# Altium footprint library LDCN Components.PcbLib: 426 footprints (part 10 of 27)
Each footprint in its own frame and in the unit in brackets; x right, y up, seen from the top. Pads: shape width x height; smd on the part's side, far side on the other; paste and mask are expansions set on the pad; w line width, h text height; cw(c..) or ccw(c..) is an arc to the next point about the centre after c.
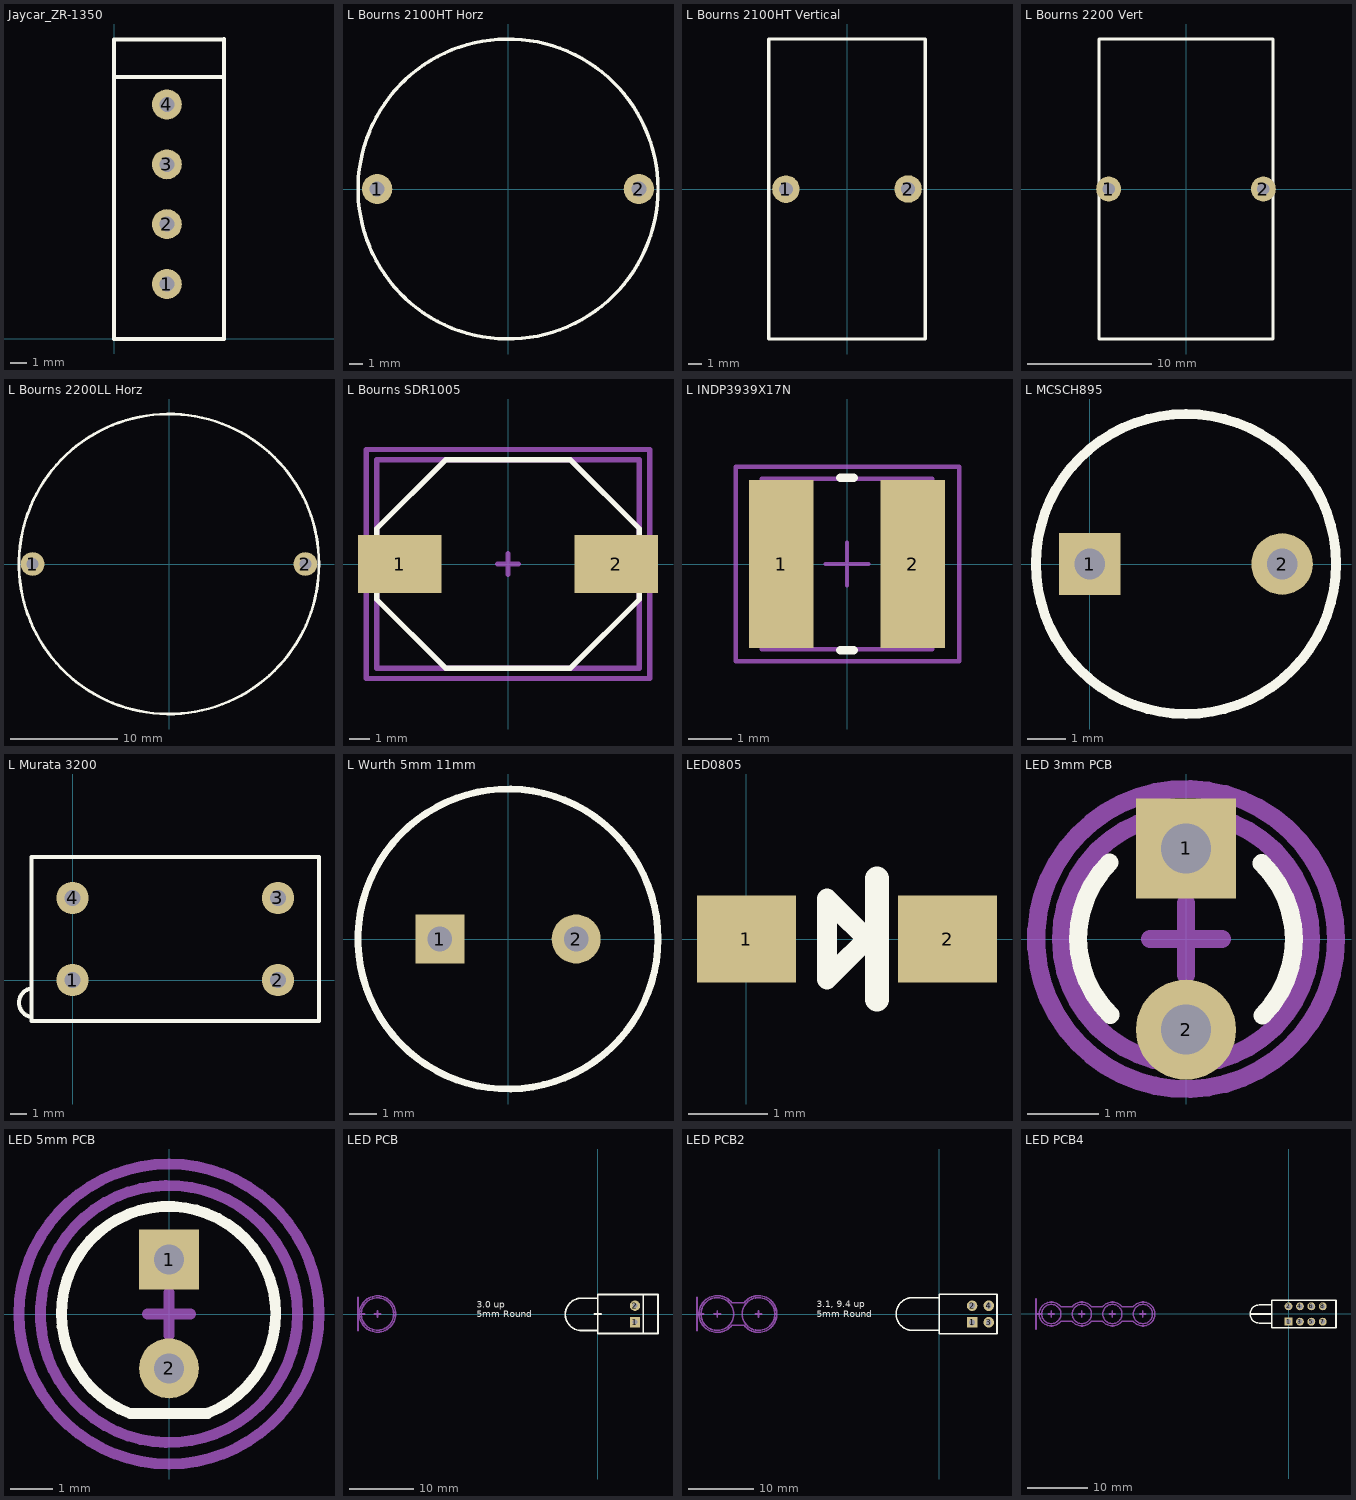
[diagram p9: the footprints below, top view; thin cyan lines are the x and y axes]

## Jaycar_ZR-1350 [mm]
pads (4):
  round 1.8 hole 0.9: 1(3.175,3.302) 2(3.175,6.902) 3(3.175,10.502) 4(3.175,14.102)
Top Overlay:
  lines w0.254: 6.604,15.748 0,15.748 0,18 ; 0,18 0,0 6.604,0 6.604,18.034 6.57,18 0,18

## L Bourns 2100HT Horz [mm] "Bourns 2100HT Series 1.1mm Hole"
height 12
pads (2):
  round 2.2 hole 1.1: 1(-9.525,0) 2(9.525,0)
Top Overlay:
  circle w0.254: c0,0 r10.922

## L Bourns 2100HT Vertical [mm] "Bourns 2100HT Series Vertical 1mm Hole"
height 21.844
pads (2):
  round 2 hole 1: 1(-4.445,0) 2(4.445,0.013)
Top Overlay:
  lines w0.254: -5.715,-10.909 -5.715,10.935 5.715,10.935 5.715,-10.909 -5.715,-10.909

## L Bourns 2200 Vert [mm] "Bourns 2200 Series Vertical 1mm Hole"
height 24.13
pads (2):
  round 2 hole 1: 1(-6.223,0) 2(6.223,0)
Top Overlay:
  lines w0.254: -6.985,-12.065 6.985,-12.065 6.985,12.065 -6.985,12.065 -6.985,-12.065

## L Bourns 2200LL Horz [mm] "Bourns 2200LL Series 1.1mm Hole"
height 13
pads (2):
  round 2.2 hole 1.1: 1(-12.7,0) 2(12.7,0)
Top Overlay:
  circle w0.254: c0,0 r13.97

## L Bourns SDR1005 [mm] "Bourns SDR1005 Inductors"
height 5
pads (2):
  rect 4x2.8 smd: 1(-5.2,0) 2(5.2,0)
Top Overlay:
  lines w0.254: -6.3,-1.7 -3,-5 3,-5 6.3,-1.7 6.3,1.7 3,5 -3,5 -6.3,1.7 -6.3,-1.7
Mechanical 13:
  lines w0.254: -6.3,-5 6.3,-5 6.3,5 -6.3,5 -6.3,-5
Mechanical 15:
  lines w0.254: -0.5,0 0.5,0 ; 0,-0.5 0,0.5 ; -6.8,-5.5 -6.8,5.5 6.8,5.5 6.8,-5.5 -6.8,-5.5
3D body: height 1, standoff 0, extent -6.3,-5 6.3,5

## L INDP3939X17N [mm] "Precision Wire Wound Inductor, 2-Leads, Body 3.9x3.9mm, IPC Medium Density"
height 1.7
pads (2):
  rect 1.5x3.9 smd: 1(-1.525,0) 2(1.525,0)
Top Overlay:
  lines w0.2: -0.15,-2 0.15,-2 ; -0.15,2 0.15,2
Mechanical 13:
  lines w0.1: -1.975,-1.975 -1.975,1.975 1.975,1.975 1.975,-1.975 -1.975,-1.975
Mechanical 15:
  lines w0.1: -0.5,0 0.5,0 ; 0,-0.5 0,0.5 ; -2.575,-2.25 -2.575,2.25 2.6,2.25 2.6,-2.25 -2.575,-2.25
3D body: height 1.7, standoff 0, extent -1.975,-1.975 1.975,1.975

## L MCSCH895 [mm] "Multicomp MCSCH895 Inductor 0.7mm Lead"
height 10
pads (2):
  rect 1.6x1.6 hole 0.8: 1(0,0)
  round 1.6 hole 0.8: 2(5,0)
Top Overlay:
  circle w0.254: c2.5,0 r3.9

## L Murata 3200 [mm] "Murata 3200 Series Vertical"
height 24
pads (4):
  round 2 hole 1: 1(0,0) 2(12.7,0) 3(12.7,5.08) 4(0,5.08)
Top Overlay:
  lines w0.254: -2.54,-2.286 cw(c-2.413,-1.397) -2.54,-0.508 ; -2.54,-2.54 -2.54,7.62 15.24,7.62 15.24,-2.54 -2.54,-2.54

## L Wurth 5mm 11mm [mm] "Wurth 5mm 11mm. 0.9mm hole"
height 11.5
pads (2):
  rect 1.8x1.8 hole 0.9: 1(-2.5,0)
  round 1.8 hole 0.9: 2(2.5,0)
Top Overlay:
  circle w0.254: c0,0 r5.5

## LED0805 [mm]
height 3
pads (2):
  rect 1.25x1.1 smd: 1(0,0) 2(2.54,0)
Top Overlay:
  lines w0.254: 1.651,-0.127 1.016,0.508 1.016,-0.508 1.651,0.127
  lines w0.305: 1.651,-0.762 1.651,0.762

## LED 3mm PCB [mm]
pads (2):
  rect 1.4x1.4 hole 0.7: 1(0,1.27)
  round 1.4 hole 0.7: 2(0,-1.27)
Top Overlay:
  lines w0.254: -1.071,1.071 ccw(c-0.01,0.01) -1.06,-1.061 ; 1.06,1.061 cw(c0.01,-0.01) 1.071,-1.071
Mechanical 21:
  circle w0.254: c0,0 r1.75
Mechanical 22:
  lines w0.254: -0.5,0 0.5,0 ; 0,-0.5 0,0.5
Mechanical 25:
  circle w0.254: c0,0 r2.1

## LED 5mm PCB [mm]
pads (2):
  rect 1.4x1.4 hole 0.7: 1(0,1.27)
  round 1.4 hole 0.7: 2(0,-1.27)
Top Overlay:
  lines w0.254: -0.904,-2.325 cw(c-0.01,0.01) 0.915,-2.312 0.903,-2.325 -0.904,-2.325
Mechanical 21:
  circle w0.254: c0,0 r3
Mechanical 22:
  lines w0.254: -0.5,0 0.5,0 ; 0,-0.5 0,0.5
Mechanical 25:
  circle w0.254: c0,0 r3.5

## LED PCB [mm]
pads (2):
  rect 1.6x1.6 hole 0.8: 1(5.75,-1.25)
  round 1.6 hole 0.8: 2(5.75,1.29)
Top Overlay:
  lines w0.254: -0.5,0 0.5,0 ; -0.047,-2.553 -2.5,-2.553 cw(c-2.5,-0.053) -2.5,2.447 -0.047,2.447 0,2.4 ; 0,-2.25 0,-1.856 ; 7,-3 7,3 ; 0,-3 9.3,-3 9.3,3 0,3 0,-3
  text "5mm Round" at -18.7,-0.5 h1.02
  text "3.0 up" at -18.7,1 h1.02
Mechanical 21:
  circle w0.254: c-34,0 r2.5
Mechanical 22:
  lines w0.254: -37,-2.54 -37,0 ; -37,2.54 -37,0 ; -36,0 -37,0 ; -34.5,0 -33.5,0 ; -34,-0.5 -34,0.5
Mechanical 25:
  circle w0.254: c-34,0 r2.8

## LED PCB2 [mm] "MARL 110 Series Bilevel"
pads (4):
  rect 1.6x1.6 hole 0.9: 1(5,-1.27)
  round 1.6 hole 0.9: 2(5,1.27) 3(7.54,-1.27) 4(7.54,1.27)
Top Overlay:
  lines w0.254: 0,-2.5 -4.1,-2.5 cw(c-4.1,0) -4.1,2.5 0,2.5 ; 0,-2.25 0,-1.856 ; 0,-3 8.8,-3 8.8,3 5,3 0,3 0,-3
  text "5mm Round" at -18.7,-0.5 h1.02
  text "3.1, 9.4 up" at -18.7,1 h1.02
Mechanical 21:
  circle w0.254: c-27.6,0 r2.5
  circle w0.254: c-33.9,0 r2.5
Mechanical 22:
  lines w0.254: -37,-2.54 -37,0 ; -37,2.54 -37,0 ; -36,0 -37,0 ; -34.4,0 -33.4,0 ; -33.9,-0.5 -33.9,0.5 ; -28.1,0 -27.1,0 ; -27.6,-0.5 -27.6,0.5
Mechanical 25:
  lines w0.254: -31.684,-1.712 cw(c-33.9,0) -31.684,1.712 -29.816,1.712 cw(c-27.6,0) -29.816,-1.712 -31.684,-1.712

## LED PCB4 [mm] "Kingbright L-710A8SB/4SRD"
pads (8):
  rect 1.3x1.3 hole 0.8: 1(0,-1.27)
  round 1.3 hole 0.8: 2(0,1.27) 3(1.9,-1.27) 4(1.9,1.27) 5(3.8,-1.27) 6(3.8,1.27) 7(5.7,-1.27) 8(5.7,1.27)
Top Overlay:
  lines w0.254: -6.4,0 -2.8,0 ; -2.8,-1.5 -4.9,-1.5 cw(c-4.9,0) -4.9,1.5 -2.8,1.5 ; -2.8,-2.25 -2.8,2.25 7.9,2.25 7.9,-2.25 -2.8,-2.25
Mechanical 21:
  circle w0.254: c-24.22,0 r1.6
  circle w0.254: c-29.3,0 r1.6
  circle w0.254: c-34.38,0 r1.6
  circle w0.254: c-39.46,0 r1.6
Mechanical 22:
  lines w0.254: -42,-2.54 -42,0 ; -42,2.54 -42,0 ; -41,0 -42,0 ; -39.96,0 -38.96,0 ; -39.46,-0.5 -39.46,0.5 ; -34.88,0 -33.88,0 ; -34.38,-0.5 -34.38,0.5 ; -29.8,0 -28.8,0 ; -29.3,-0.5 -29.3,0.5 ; -24.72,0 -23.72,0 ; -24.22,-0.5 -24.22,0.5
Mechanical 25:
  lines w0.254: -35.969,1.214 cw(c-34.38,0) -32.797,1.223 -30.883,1.223 cw(c-29.3,0) -27.717,1.223 -25.803,1.223 cw(c-24.22,0) -25.803,-1.223 -27.717,-1.223 cw(c-29.3,0) -30.883,-1.223 -32.797,-1.223 ; -35.963,1.223 -37.877,1.223 ccw(c-39.46,0) -37.877,-1.223 -35.963,-1.223 ccw(c-34.38,0) -32.791,-1.214